# Altium footprint library PFC_Stage.PcbLib: 60 footprints (part 2 of 4)
Each footprint in its own frame and in the unit in brackets; x right, y up, seen from the top. Pads: shape width x height; smd on the part's side, far side on the other; paste and mask are expansions set on the pad; w line width, h text height; cw(c..) or ccw(c..) is an arc to the next point about the centre after c.
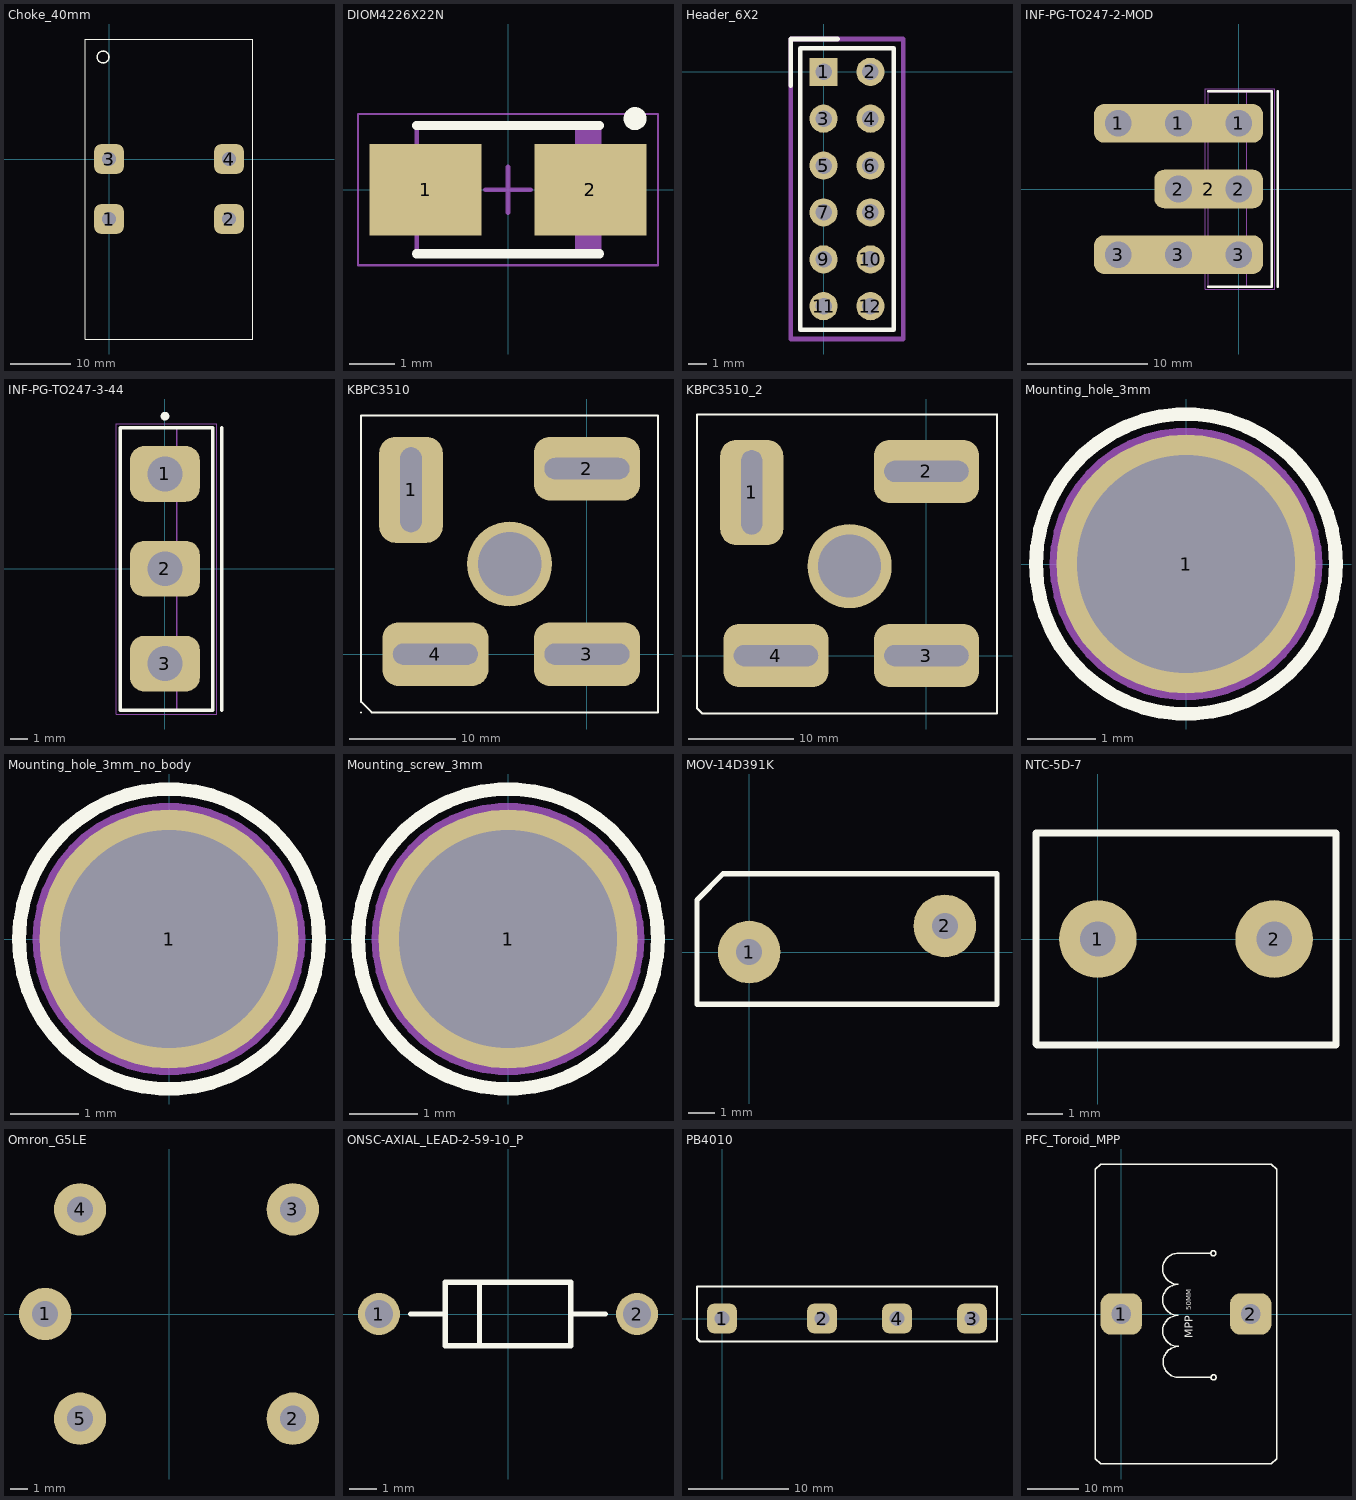
[diagram p1: the footprints below, top view; thin cyan lines are the x and y axes]

## Choke_40mm [mm]
pads (4):
  rrect50% 5x5 hole 2.4: 1(0,-10) 2(20,-10) 3(0,0) 4(20,0)
Top Overlay:
  circle w0.254: c-1,17 r1
  lines w0.2: -4,-30 24,-30 24,20 -4,20 -4,0 -4,-30
3D body "Toroid_40mm.STEP": height 54.5, standoff -10, extent -1.05,-29.5 20.95,19.5

## DIOM4226X22N [mm] "Molded Diode, 2-Leads, Body 4.25x2.64mm, IPC Medium Density"
height 2.25
pads (2):
  rect 2.45x2 smd: 1(-1.8,0) 2(1.8,0)
Top Overlay:
  circle w0.25: c2.775,1.55 r0.125
  lines w0.2: -2,-1.4 2,-1.4 ; -2,1.4 2,1.4
Mechanical 13:
  rectangle: 1.458,-1.37 1.995,1.37
  lines w0.1: -1.995,-1.37 -1.995,1.37 1.995,1.37 1.995,-1.37 -1.995,-1.37
Mechanical 15:
  lines w0.05: -3.275,-1.65 -3.275,1.65 3.275,1.65 3.275,-1.65 -3.275,-1.65
  lines w0.1: -0.5,0 0.5,0 ; 0,-0.5 0,0.5
3D body "DIOM4226X22N.step": height 2.25, standoff 0, extent -2.215,-1.37 2.215,1.37

## Header_6X2 [mil]
pads (12):
  rect 60x60 hole 35.43: 1(0,0)
  round 60 hole 35.43: 2(100,0) 3(0,-100) 4(100,-100) 5(0,-200) 6(100,-200) 7(0,-300) 8(100,-300) 9(0,-400) 10(100,-400) 11(0,-500) 12(100,-500)
Top Overlay:
  lines w10: -70,-30 -70,70 30,70 ; -50,-550 -50,50 150,50 150,-550 -30,-550 -50,-550
Mechanical 13:
  lines w10: -70,-570 -70,70 170,70 170,-570 -70,-570
  text "'.Designator'" at -129.99,-600 h60
3D body "PinHeader_2x06_P2.54mm_Horizontal.step": height 200, standoff -118.11, extent -12.59,-550 495.28,50

## INF-PG-TO247-2-MOD [mm] "FM, 3-Leads, Body 5.02x15.94mm, Pitch 5.44mm"
height 25.5
pads (9):
  round 2.5 hole 2.2: 1(-10,5.44) 1(0,5.44) 2(-5,0) 2(0,0) 3(-10,-5.44) 3(0,-5.44)
  rrect50% 14x3.2 hole 2.2: 1(-5,5.44) 3(-5,-5.44)
  rrect50% 9x3.2 all layers, no hole: 2(-2.5,0)
Top Overlay:
  circle w0.25: c0,5.44 r0.125
  lines w0.2: -2.555,-8.1 2.745,-8.1 2.745,8.1 -2.555,8.1 ; 3.245,-8.1 3.245,8.1
Mechanical 13:
  lines w0.1: 0.67,-8.075 0.67,8.075 ; -2.53,-8.075 -2.53,8.075 2.72,8.075 2.72,-8.075 -2.53,-8.075
Mechanical 15:
  lines w0.05: -2.78,-8.325 2.97,-8.325 2.97,8.325 -2.78,8.325 -2.78,-8.325
  lines w0.1: -0.5,0 0.5,0 ; 0,-0.5 0,0.5
3D body "User Library-User Library-TO-247_NO_CENTER_LEAD.x_t": height 27.5, standoff -8.9, extent -2.505,-7.95 2.805,7.95

## INF-PG-TO247-3-44 [mm] "FM, 3-Leads, Body 5.02x15.94mm, Pitch 5.44mm"
height 25.5
pads (3):
  rrect50% 4x3.2 hole 2: 1(0,5.44) 2(0,0) 3(0,-5.44)
Top Overlay:
  circle w0.25: c0,8.75 r0.125
  lines w0.2: 3.245,-8.1 3.245,8.1 ; -2.555,-8.1 2.745,-8.1 2.745,8.1 -2.555,8.1 -2.555,-8.1
Mechanical 13:
  lines w0.1: 0.67,-8.075 0.67,8.075 ; -2.53,-8.075 -2.53,8.075 2.72,8.075 2.72,-8.075 -2.53,-8.075
Mechanical 15:
  lines w0.05: -2.78,-8.325 -2.78,8.325 2.97,8.325 2.97,-8.325 -2.78,-8.325
  lines w0.1: -0.5,0 0.5,0 ; 0,-0.5 0,0.5
3D body "TO-247-3_Vertical.step": height 26.54, standoff -14.56, extent -2.33,-7.96 2.7,7.94

## KBPC3510 [mm]
pads (5):
  rrect50% 6x10 hole 8 slot 2 at 0 deg: 1(-16.6,15.5)
  rrect50% 10x6 hole 2 slot 8 at 0 deg: 2(0,17.5) 3(0,0) 4(-14.3,0)
  round 8 hole 6: ""(-7.3,8.5)
Top Overlay:
  lines w0.2: 6.7,22.5 -21.3,22.5 -21.3,-4.5 -20.3,-5.5 6.7,-5.5 6.7,22.5 ; 6.7,22.5 6.7,22.5 ; -21.3,-5.5 -21.3,-5.5
3D body "Rectifier KBPC3510 v1.step": height 2.02, standoff -20, extent -21.3,-5.5 6.7,22.5

## KBPC3510_2 [mm]
pads (5):
  rrect50% 6x10 hole 8 slot 2 at 0 deg: 1(-16.6,15.5)
  rrect50% 10x6 hole 2 slot 8 at 0 deg: 2(0,17.5) 3(0,0) 4(-14.3,0)
  round 8 hole 6: ""(-7.3,8.5)
Top Overlay:
  lines w0.2: -21.3,-5.5 -21.3,-5.5 ; -21.3,-5.5 -21.8,-5 -21.8,14 -21.8,22.9 6.7,22.9 ; -21.3,-5.5 -20.3,-5.5 6.7,-5.5 6.7,22.5 ; 6.7,22.5 6.7,22.5 ; 6.7,22.5 6.7,22.9 ; 6.7,22.9 6.7,22.9
3D body "50A KBPC5010 1000V Metal Case Single Phases Diode Bridge Rectifier.STEP": height 10.5, standoff -11, extent -21.85,-5.55 6.65,22.95

## Mounting_hole_3mm [mm]
pads (1):
  round 3.8 hole 3.2: 1(0,0)
Top Overlay:
  circle w0.2: c0,0 r2.2
Mechanical 1:
  circle w0.2: c0,0 r1.9
3D body "16_4mm.stp": height 16.5, standoff 0.5, extent -4.619,-4 4.619,4
3D body "971650485_Download_STEP_971650485_rev1.stp": height 7, standoff -66, extent -4.619,-4 4.619,4
3D body "16_4mm.stp": height -66, standoff -82, extent -4.619,-4 4.619,4

## Mounting_hole_3mm_no_body [mm]
pads (1):
  round 3.8 hole 3.2: 1(0,0)
Top Overlay:
  circle w0.2: c0,0 r2.2
Mechanical 1:
  circle w0.2: c0,0 r1.9

## Mounting_screw_3mm [mm]
pads (1):
  round 3.8 hole 3.2: 1(0,0)
Top Overlay:
  circle w0.2: c0,0 r2.2
Mechanical 1:
  circle w0.2: c0,0 r1.9
3D body "4mm_screw.x_t": height 3.13, standoff -4.87, extent -2.766,-2.732 2.734,2.768

## MOV-14D391K [mm]
pads (2):
  round 2.4 hole 1: 1(0,0) 2(7.5,1)
Top Overlay:
  lines w0.2: -2,-2 9.5,-2 9.5,3 -1,3 -2,2 -2,1.5 -2,-2
3D body "mov-14d431k.x_t": height 23.25, standoff -1.75, extent -4.475,-2.125 12.025,3.075

## NTC-5D-7 [mm]
pads (2):
  round 2.2 hole 1: 1(0,0) 2(5,0)
Top Overlay:
  lines w0.2: -1.75,-2.975 -1.75,3 6.75,3 6.75,-3 -1.725,-3 -1.75,-2.975
3D body "User Library-B57153-1.X_T": height 20.25, standoff -2, extent -1.75,-3 6.75,3

## Omron_G5LE [mm]
pads (5):
  round 3 hole 1.5: 1(-7.1,0) 2(7.1,-6) 3(7.1,6) 4(-5.1,6) 5(-5.1,-6)
3D body "Omron Single.stp": height 19, standoff -3.5, extent -9.775,-8.35 12.925,8.55

## ONSC-AXIAL_LEAD-2-59-10_P [mm] "AXIAL, 2-Leads, Diameter 2.35mm"
height 2.35
pads (2):
  round 1.55 hole 1.05: 1(-4.77,0) 2(4.77,0)
Top Overlay:
  lines w0.2: -3.595,0 -2.325,0 ; -1.055,-1.175 -1.055,1.175 ; 2.325,0 3.595,0 ; -2.325,-1.175 -2.325,1.175 2.325,1.175 2.325,-1.175 -2.325,-1.175

## PB4010 [mm]
pads (4):
  rrect50% 3x3 hole 1.5: 1(0,0) 2(10,0) 3(25,0) 4(17.5,0)
Top Overlay:
  lines w0.2: -2.5,-2 -2.2,-2.3 27.5,-2.3 27.5,3.2 -2.5,3.2 -2.5,-1.8 -2.5,-2
3D body "4-ESIP, PB v1.step": height 30, standoff -7.5, extent -2.5,-1.6 27.5,3.2

## PFC_Toroid_MPP [mm] "Vertica_Bobbin"
pads (2):
  rrect50% 8x8 hole 3.8: 1(0,0) 2(25,0)
Top Overlay:
  circle w0.254: c17.825,-12.25 r0.5
  circle w0.254: c17.79,11.737 r0.5
  lines w0.254: 10.99,-6.263 cw(c10.99,-3.263) 10.99,-0.263 cw(c10.99,2.737) 10.99,5.737 cw(c10.99,8.737) 10.99,11.737 17.19,11.737 ; 11.09,-6.263 ccw(c11.09,-9.263) 11.09,-12.263 17.19,-12.263 ; -5,-28 -4,-29 29,-29 30,-28 30,28 29,29 -4,29 -5,28 -5,0 -5,-28
  text "50MM" at 13.471,0.729 h1
  text "MPP" at 13.846,-4.721 h1.52
3D body "PFC.x_t": height 58.65, standoff -10.15, extent -0.925,-28.627 26.665,28.677